# Altium schematic symbol library jlcpcb_2025_04_capacitors_extended_0402.schlib: 3594 symbols (part 8 of 20)
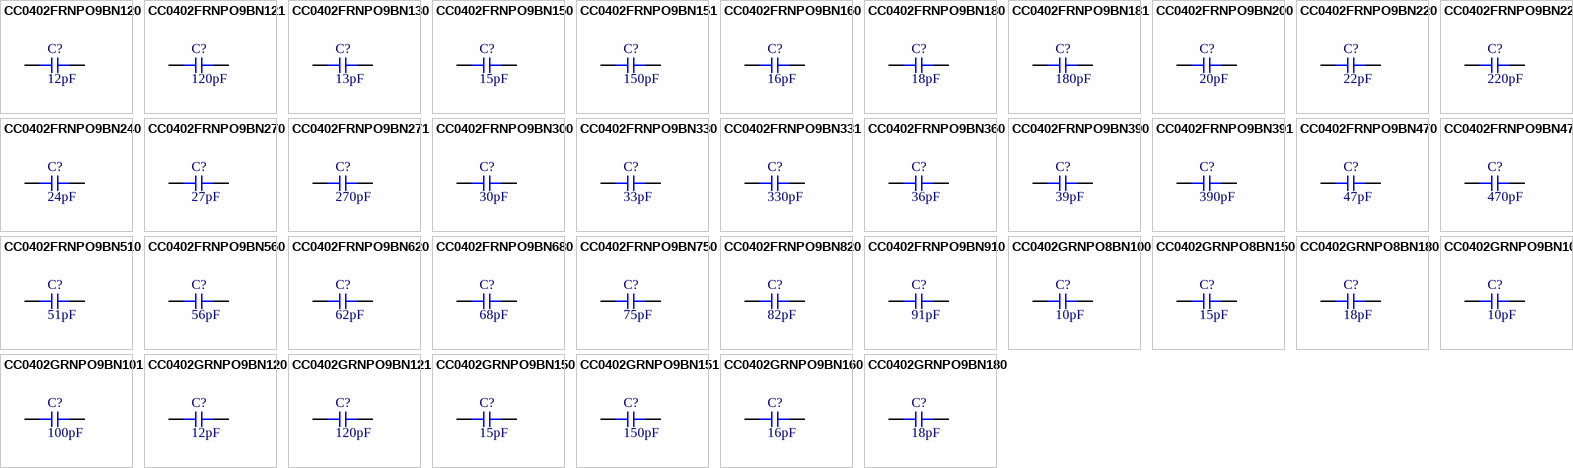
[diagram p96: symbols CC0402FRNPO9BN120 to CC0402GRNPO9BN180]

## CC0402FRNPO9BN470
designator C?  Capacitance: 47pF  (hidden comment: *)
Capacitor, Ceramic (MLCC), 47pF, ±1%, 50V, NP0, ±1%, SMD 0402; Manufacturer: YAGEO; Manufacturer Part Number: CC0402FRNPO9BN470; Package Size: 0402; JLCPCB Basic Part: No; JLCPCB Part Number: C277503; Supplier 1: LCSC; Category: Capacitors - MLCC; Supplier Part Number 1: C277503; Tolerance: ±1%; Voltage Rating: 50V; Temperature Coefficient: NP0; RoHS: Yes; ComponentLink1Description: Datasheet; ComponentLink1URL: https://wmsc.lcsc.com/wmsc/upload/file/pdf/v2/lcsc/2304140030_YAGEO-CC0402FRNPO9BN470_C277503.pdf; ComponentLink2Description: JLCPCB Part URL; ComponentLink2URL: https://jlcpcb.com/partdetail/C277503; ComponentLink3Description: LCSC Part URL; ComponentLink3URL: https://lcsc.com/product-detail/Multilayer-Ceramic-Capacitors-MLCC---SMD-SMT_YAGEO-YAGEO-CC0402FRNPO9BN470_C277503.html
footprint CAP-0402 (0402 (1005M) Capacitor)
pins: 1, 2

## CC0402FRNPO9BN471
designator C?  Capacitance: 470pF  (hidden comment: *)
Capacitor, Ceramic (MLCC), 470pF, ±1%, 50V, NP0, ±1%, SMD 0402; Manufacturer: YAGEO; Manufacturer Part Number: CC0402FRNPO9BN471; Package Size: 0402; JLCPCB Basic Part: No; JLCPCB Part Number: C513551; Supplier 1: LCSC; Category: Capacitors - MLCC; Supplier Part Number 1: C513551; Tolerance: ±1%; Voltage Rating: 50V; Temperature Coefficient: NP0; RoHS: Yes; ComponentLink1Description: Datasheet; ComponentLink1URL: https://wmsc.lcsc.com/wmsc/upload/file/pdf/v2/lcsc/2004231432_YAGEO-CC0402FRNPO9BN471_C513551.pdf; ComponentLink2Description: JLCPCB Part URL; ComponentLink2URL: https://jlcpcb.com/partdetail/C513551; ComponentLink3Description: LCSC Part URL; ComponentLink3URL: https://lcsc.com/product-detail/Multilayer-Ceramic-Capacitors-MLCC---SMD-SMT_YAGEO-YAGEO-CC0402FRNPO9BN471_C513551.html
footprint CAP-0402 (0402 (1005M) Capacitor)
pins: 1, 2

## CC0402FRNPO9BN510
designator C?  Capacitance: 51pF  (hidden comment: *)
Capacitor, Ceramic (MLCC), 51pF, ±1%, 50V, NP0, ±1%, SMD 0402; Manufacturer: YAGEO; Manufacturer Part Number: CC0402FRNPO9BN510; Package Size: 0402; JLCPCB Basic Part: No; JLCPCB Part Number: C541437; Supplier 1: LCSC; Category: Capacitors - MLCC; Supplier Part Number 1: C541437; Tolerance: ±1%; Voltage Rating: 50V; Temperature Coefficient: NP0; RoHS: Yes; ComponentLink1Description: Datasheet; ComponentLink1URL: https://wmsc.lcsc.com/wmsc/upload/file/pdf/v2/lcsc/2006151135_YAGEO-CC0402FRNPO9BN510_C541437.pdf; ComponentLink2Description: JLCPCB Part URL; ComponentLink2URL: https://jlcpcb.com/partdetail/C541437; ComponentLink3Description: LCSC Part URL; ComponentLink3URL: https://lcsc.com/product-detail/Multilayer-Ceramic-Capacitors-MLCC---SMD-SMT_YAGEO-YAGEO-CC0402FRNPO9BN510_C541437.html
footprint CAP-0402 (0402 (1005M) Capacitor)
pins: 1, 2

## CC0402FRNPO9BN560
designator C?  Capacitance: 56pF  (hidden comment: *)
Capacitor, Ceramic (MLCC), 56pF, ±1%, 50V, NP0, ±1%, SMD 0402; Manufacturer: YAGEO; Manufacturer Part Number: CC0402FRNPO9BN560; Package Size: 0402; JLCPCB Basic Part: No; JLCPCB Part Number: C526981; Supplier 1: LCSC; Category: Capacitors - MLCC; Supplier Part Number 1: C526981; Tolerance: ±1%; Voltage Rating: 50V; Temperature Coefficient: NP0; RoHS: Yes; ComponentLink1Description: Datasheet; ComponentLink1URL: https://wmsc.lcsc.com/wmsc/upload/file/pdf/v2/lcsc/2005262133_YAGEO-CC0402FRNPO9BN560_C526981.pdf; ComponentLink2Description: JLCPCB Part URL; ComponentLink2URL: https://jlcpcb.com/partdetail/C526981; ComponentLink3Description: LCSC Part URL; ComponentLink3URL: https://lcsc.com/product-detail/Multilayer-Ceramic-Capacitors-MLCC---SMD-SMT_YAGEO-YAGEO-CC0402FRNPO9BN560_C526981.html
footprint CAP-0402 (0402 (1005M) Capacitor)
pins: 1, 2

## CC0402FRNPO9BN620
designator C?  Capacitance: 62pF  (hidden comment: *)
Capacitor, Ceramic (MLCC), 62pF, ±1%, 50V, NP0, ±1%, SMD 0402; Manufacturer: YAGEO; Manufacturer Part Number: CC0402FRNPO9BN620; Package Size: 0402; JLCPCB Basic Part: No; JLCPCB Part Number: C541438; Supplier 1: LCSC; Category: Capacitors - MLCC; Supplier Part Number 1: C541438; Tolerance: ±1%; Voltage Rating: 50V; Temperature Coefficient: NP0; RoHS: Yes; ComponentLink1Description: Datasheet; ComponentLink1URL: https://wmsc.lcsc.com/wmsc/upload/file/pdf/v2/lcsc/2304140030_YAGEO-CC0402FRNPO9BN620_C541438.pdf; ComponentLink2Description: JLCPCB Part URL; ComponentLink2URL: https://jlcpcb.com/partdetail/C541438; ComponentLink3Description: LCSC Part URL; ComponentLink3URL: https://lcsc.com/product-detail/Multilayer-Ceramic-Capacitors-MLCC---SMD-SMT_YAGEO-YAGEO-CC0402FRNPO9BN620_C541438.html
footprint CAP-0402 (0402 (1005M) Capacitor)
pins: 1, 2

## CC0402FRNPO9BN680
designator C?  Capacitance: 68pF  (hidden comment: *)
Capacitor, Ceramic (MLCC), 68pF, ±1%, 50V, NP0, ±1%, SMD 0402; Manufacturer: YAGEO; Manufacturer Part Number: CC0402FRNPO9BN680; Package Size: 0402; JLCPCB Basic Part: No; JLCPCB Part Number: C389103; Supplier 1: LCSC; Category: Capacitors - MLCC; Supplier Part Number 1: C389103; Tolerance: ±1%; Voltage Rating: 50V; Temperature Coefficient: NP0; RoHS: Yes; ComponentLink1Description: Datasheet; ComponentLink1URL: https://wmsc.lcsc.com/wmsc/upload/file/pdf/v2/lcsc/1912111437_YAGEO-CC0402FRNPO9BN680_C389103.pdf; ComponentLink2Description: JLCPCB Part URL; ComponentLink2URL: https://jlcpcb.com/partdetail/C389103; ComponentLink3Description: LCSC Part URL; ComponentLink3URL: https://lcsc.com/product-detail/Multilayer-Ceramic-Capacitors-MLCC---SMD-SMT_YAGEO-YAGEO-CC0402FRNPO9BN680_C389103.html
footprint CAP-0402 (0402 (1005M) Capacitor)
pins: 1, 2

## CC0402FRNPO9BN750
designator C?  Capacitance: 75pF  (hidden comment: *)
Capacitor, Ceramic (MLCC), 75pF, 50V, NP0, SMD 0402; Manufacturer: YAGEO; Manufacturer Part Number: CC0402FRNPO9BN750; Package Size: 0402; JLCPCB Basic Part: No; JLCPCB Part Number: C541439; Supplier 1: LCSC; Category: Capacitors - MLCC; Supplier Part Number 1: C541439; Voltage Rating: 50V; Temperature Coefficient: NP0; RoHS: Yes; ComponentLink1Description: Datasheet; ComponentLink1URL: https://wmsc.lcsc.com/wmsc/upload/file/pdf/v2/lcsc/2006151135_YAGEO-CC0402FRNPO9BN750_C541439.pdf; ComponentLink2Description: JLCPCB Part URL; ComponentLink2URL: https://jlcpcb.com/partdetail/C541439; ComponentLink3Description: LCSC Part URL; ComponentLink3URL: https://lcsc.com/product-detail/Multilayer-Ceramic-Capacitors-MLCC---SMD-SMT_YAGEO-YAGEO-CC0402FRNPO9BN750_C541439.html
footprint CAP-0402 (0402 (1005M) Capacitor)
pins: 1, 2

## CC0402FRNPO9BN820
designator C?  Capacitance: 82pF  (hidden comment: *)
Capacitor, Ceramic (MLCC), 82pF, ±1%, 50V, NP0, ±1%, SMD 0402; Manufacturer: YAGEO; Manufacturer Part Number: CC0402FRNPO9BN820; Package Size: 0402; JLCPCB Basic Part: No; JLCPCB Part Number: C526982; Supplier 1: LCSC; Category: Capacitors - MLCC; Supplier Part Number 1: C526982; Tolerance: ±1%; Voltage Rating: 50V; Temperature Coefficient: NP0; RoHS: Yes; ComponentLink1Description: Datasheet; ComponentLink1URL: https://wmsc.lcsc.com/wmsc/upload/file/pdf/v2/lcsc/2006031834_YAGEO-CC0402FRNPO9BN820_C526982.pdf; ComponentLink2Description: JLCPCB Part URL; ComponentLink2URL: https://jlcpcb.com/partdetail/C526982; ComponentLink3Description: LCSC Part URL; ComponentLink3URL: https://lcsc.com/product-detail/Multilayer-Ceramic-Capacitors-MLCC---SMD-SMT_YAGEO-YAGEO-CC0402FRNPO9BN820_C526982.html
footprint CAP-0402 (0402 (1005M) Capacitor)
pins: 1, 2

## CC0402FRNPO9BN910
designator C?  Capacitance: 91pF  (hidden comment: *)
Capacitor, Ceramic (MLCC), 91pF, 50V, NP0, SMD 0402; Manufacturer: YAGEO; Manufacturer Part Number: CC0402FRNPO9BN910; Package Size: 0402; JLCPCB Basic Part: No; JLCPCB Part Number: C541440; Supplier 1: LCSC; Category: Capacitors - MLCC; Supplier Part Number 1: C541440; Voltage Rating: 50V; Temperature Coefficient: NP0; RoHS: Yes; ComponentLink1Description: Datasheet; ComponentLink1URL: https://wmsc.lcsc.com/wmsc/upload/file/pdf/v2/lcsc/2006151136_YAGEO-CC0402FRNPO9BN910_C541440.pdf; ComponentLink2Description: JLCPCB Part URL; ComponentLink2URL: https://jlcpcb.com/partdetail/C541440; ComponentLink3Description: LCSC Part URL; ComponentLink3URL: https://lcsc.com/product-detail/Multilayer-Ceramic-Capacitors-MLCC---SMD-SMT_YAGEO-YAGEO-CC0402FRNPO9BN910_C541440.html
footprint CAP-0402 (0402 (1005M) Capacitor)
pins: 1, 2

## CC0402GRNPO8BN100
designator C?  Capacitance: 10pF  (hidden comment: *)
Capacitor, Ceramic (MLCC), 10pF, ±2%, 25V, NP0, ±2%, SMD 0402; Manufacturer: YAGEO; Manufacturer Part Number: CC0402GRNPO8BN100; Package Size: 0402; JLCPCB Basic Part: No; JLCPCB Part Number: C526983; Supplier 1: LCSC; Category: Capacitors - MLCC; Supplier Part Number 1: C526983; Tolerance: ±2%; Voltage Rating: 25V; Temperature Coefficient: NP0; RoHS: Yes; ComponentLink1Description: Datasheet; ComponentLink1URL: https://wmsc.lcsc.com/wmsc/upload/file/pdf/v2/lcsc/2005261832_YAGEO-CC0402GRNPO8BN100_C526983.pdf; ComponentLink2Description: JLCPCB Part URL; ComponentLink2URL: https://jlcpcb.com/partdetail/C526983; ComponentLink3Description: LCSC Part URL; ComponentLink3URL: https://lcsc.com/product-detail/Multilayer-Ceramic-Capacitors-MLCC---SMD-SMT_YAGEO-YAGEO-CC0402GRNPO8BN100_C526983.html
footprint CAP-0402 (0402 (1005M) Capacitor)
pins: 1, 2

## CC0402GRNPO8BN150
designator C?  Capacitance: 15pF  (hidden comment: *)
Capacitor, Ceramic (MLCC), 15pF, ±2%, 25V, NP0, ±2%, SMD 0402; Manufacturer: YAGEO; Manufacturer Part Number: CC0402GRNPO8BN150; Package Size: 0402; JLCPCB Basic Part: No; JLCPCB Part Number: C326789; Supplier 1: LCSC; Category: Capacitors - MLCC; Supplier Part Number 1: C326789; Tolerance: ±2%; Voltage Rating: 25V; Temperature Coefficient: NP0; RoHS: Yes; ComponentLink1Description: Datasheet; ComponentLink1URL: https://wmsc.lcsc.com/wmsc/upload/file/pdf/v2/lcsc/1811141241_YAGEO-CC0402GRNPO8BN150_C326789.pdf; ComponentLink2Description: JLCPCB Part URL; ComponentLink2URL: https://jlcpcb.com/partdetail/C326789; ComponentLink3Description: LCSC Part URL; ComponentLink3URL: https://lcsc.com/product-detail/Multilayer-Ceramic-Capacitors-MLCC---SMD-SMT_YAGEO-YAGEO-CC0402GRNPO8BN150_C326789.html
footprint CAP-0402 (0402 (1005M) Capacitor)
pins: 1, 2

## CC0402GRNPO8BN180
designator C?  Capacitance: 18pF  (hidden comment: *)
Capacitor, Ceramic (MLCC), 18pF, ±2%, 25V, NP0, ±2%, SMD 0402; Manufacturer: YAGEO; Manufacturer Part Number: CC0402GRNPO8BN180; Package Size: 0402; JLCPCB Basic Part: No; JLCPCB Part Number: C526984; Supplier 1: LCSC; Category: Capacitors - MLCC; Supplier Part Number 1: C526984; Tolerance: ±2%; Voltage Rating: 25V; Temperature Coefficient: NP0; RoHS: Yes; ComponentLink1Description: Datasheet; ComponentLink1URL: https://wmsc.lcsc.com/wmsc/upload/file/pdf/v2/lcsc/2007221234_YAGEO-CC0402GRNPO8BN180_C526984.pdf; ComponentLink2Description: JLCPCB Part URL; ComponentLink2URL: https://jlcpcb.com/partdetail/C526984; ComponentLink3Description: LCSC Part URL; ComponentLink3URL: https://lcsc.com/product-detail/Multilayer-Ceramic-Capacitors-MLCC---SMD-SMT_YAGEO-YAGEO-CC0402GRNPO8BN180_C526984.html
footprint CAP-0402 (0402 (1005M) Capacitor)
pins: 1, 2

## CC0402GRNPO9BN100
designator C?  Capacitance: 10pF  (hidden comment: *)
Capacitor, Ceramic (MLCC), 10pF, ±2%, 50V, NP0, ±2%, SMD 0402; Manufacturer: YAGEO; Manufacturer Part Number: CC0402GRNPO9BN100; Package Size: 0402; JLCPCB Basic Part: No; JLCPCB Part Number: C325459; Supplier 1: LCSC; Category: Capacitors - MLCC; Supplier Part Number 1: C325459; Tolerance: ±2%; Voltage Rating: 50V; Temperature Coefficient: NP0; RoHS: Yes; ComponentLink1Description: Datasheet; ComponentLink1URL: https://wmsc.lcsc.com/wmsc/upload/file/pdf/v2/lcsc/1811070918_YAGEO-CC0402GRNPO9BN100_C325459.pdf; ComponentLink2Description: JLCPCB Part URL; ComponentLink2URL: https://jlcpcb.com/partdetail/C325459; ComponentLink3Description: LCSC Part URL; ComponentLink3URL: https://lcsc.com/product-detail/Multilayer-Ceramic-Capacitors-MLCC---SMD-SMT_YAGEO-YAGEO-CC0402GRNPO9BN100_C325459.html
footprint CAP-0402 (0402 (1005M) Capacitor)
pins: 1, 2

## CC0402GRNPO9BN101
designator C?  Capacitance: 100pF  (hidden comment: *)
Capacitor, Ceramic (MLCC), 100pF, ±2%, 50V, NP0, ±2%, SMD 0402; Manufacturer: YAGEO; Manufacturer Part Number: CC0402GRNPO9BN101; Package Size: 0402; JLCPCB Basic Part: No; JLCPCB Part Number: C277521; Supplier 1: LCSC; Category: Capacitors - MLCC; Supplier Part Number 1: C277521; Tolerance: ±2%; Voltage Rating: 50V; Temperature Coefficient: NP0; RoHS: Yes; ComponentLink1Description: Datasheet; ComponentLink1URL: https://wmsc.lcsc.com/wmsc/upload/file/pdf/v2/lcsc/2304140030_YAGEO-CC0402GRNPO9BN101_C277521.pdf; ComponentLink2Description: JLCPCB Part URL; ComponentLink2URL: https://jlcpcb.com/partdetail/C277521; ComponentLink3Description: LCSC Part URL; ComponentLink3URL: https://lcsc.com/product-detail/Multilayer-Ceramic-Capacitors-MLCC---SMD-SMT_YAGEO-YAGEO-CC0402GRNPO9BN101_C277521.html
footprint CAP-0402 (0402 (1005M) Capacitor)
pins: 1, 2

## CC0402GRNPO9BN120
designator C?  Capacitance: 12pF  (hidden comment: *)
Capacitor, Ceramic (MLCC), 12pF, ±2%, 50V, NP0, ±2%, SMD 0402; Manufacturer: YAGEO; Manufacturer Part Number: CC0402GRNPO9BN120; Package Size: 0402; JLCPCB Basic Part: No; JLCPCB Part Number: C526985; Supplier 1: LCSC; Category: Capacitors - MLCC; Supplier Part Number 1: C526985; Tolerance: ±2%; Voltage Rating: 50V; Temperature Coefficient: NP0; RoHS: Yes; ComponentLink1Description: Datasheet; ComponentLink1URL: https://wmsc.lcsc.com/wmsc/upload/file/pdf/v2/lcsc/2006101834_YAGEO-CC0402GRNPO9BN120_C526985.pdf; ComponentLink2Description: JLCPCB Part URL; ComponentLink2URL: https://jlcpcb.com/partdetail/C526985; ComponentLink3Description: LCSC Part URL; ComponentLink3URL: https://lcsc.com/product-detail/Multilayer-Ceramic-Capacitors-MLCC---SMD-SMT_YAGEO-YAGEO-CC0402GRNPO9BN120_C526985.html
footprint CAP-0402 (0402 (1005M) Capacitor)
pins: 1, 2

## CC0402GRNPO9BN121
designator C?  Capacitance: 120pF  (hidden comment: *)
Capacitor, Ceramic (MLCC), 120pF, ±2%, 50V, NP0, ±2%, SMD 0402; Manufacturer: YAGEO; Manufacturer Part Number: CC0402GRNPO9BN121; Package Size: 0402; JLCPCB Basic Part: No; JLCPCB Part Number: C526986; Supplier 1: LCSC; Category: Capacitors - MLCC; Supplier Part Number 1: C526986; Tolerance: ±2%; Voltage Rating: 50V; Temperature Coefficient: NP0; RoHS: Yes; ComponentLink1Description: Datasheet; ComponentLink1URL: https://wmsc.lcsc.com/wmsc/upload/file/pdf/v2/lcsc/2006031834_YAGEO-CC0402GRNPO9BN121_C526986.pdf; ComponentLink2Description: JLCPCB Part URL; ComponentLink2URL: https://jlcpcb.com/partdetail/C526986; ComponentLink3Description: LCSC Part URL; ComponentLink3URL: https://lcsc.com/product-detail/Multilayer-Ceramic-Capacitors-MLCC---SMD-SMT_YAGEO-YAGEO-CC0402GRNPO9BN121_C526986.html
footprint CAP-0402 (0402 (1005M) Capacitor)
pins: 1, 2

## CC0402GRNPO9BN150
designator C?  Capacitance: 15pF  (hidden comment: *)
Capacitor, Ceramic (MLCC), 15pF, ±2%, 50V, NP0, ±2%, SMD 0402; Manufacturer: YAGEO; Manufacturer Part Number: CC0402GRNPO9BN150; Package Size: 0402; JLCPCB Basic Part: No; JLCPCB Part Number: C325460; Supplier 1: LCSC; Category: Capacitors - MLCC; Supplier Part Number 1: C325460; Tolerance: ±2%; Voltage Rating: 50V; Temperature Coefficient: NP0; RoHS: Yes; ComponentLink1Description: Datasheet; ComponentLink1URL: https://wmsc.lcsc.com/wmsc/upload/file/pdf/v2/lcsc/1811070918_YAGEO-CC0402GRNPO9BN150_C325460.pdf; ComponentLink2Description: JLCPCB Part URL; ComponentLink2URL: https://jlcpcb.com/partdetail/C325460; ComponentLink3Description: LCSC Part URL; ComponentLink3URL: https://lcsc.com/product-detail/Multilayer-Ceramic-Capacitors-MLCC---SMD-SMT_YAGEO-YAGEO-CC0402GRNPO9BN150_C325460.html
footprint CAP-0402 (0402 (1005M) Capacitor)
pins: 1, 2

## CC0402GRNPO9BN151
designator C?  Capacitance: 150pF  (hidden comment: *)
Capacitor, Ceramic (MLCC), 150pF, ±2%, 50V, NP0, ±2%, SMD 0402; Manufacturer: YAGEO; Manufacturer Part Number: CC0402GRNPO9BN151; Package Size: 0402; JLCPCB Basic Part: No; JLCPCB Part Number: C541423; Supplier 1: LCSC; Category: Capacitors - MLCC; Supplier Part Number 1: C541423; Tolerance: ±2%; Voltage Rating: 50V; Temperature Coefficient: NP0; RoHS: Yes; ComponentLink1Description: Datasheet; ComponentLink1URL: https://wmsc.lcsc.com/wmsc/upload/file/pdf/v2/lcsc/2006151134_YAGEO-CC0402GRNPO9BN151_C541423.pdf; ComponentLink2Description: JLCPCB Part URL; ComponentLink2URL: https://jlcpcb.com/partdetail/C541423; ComponentLink3Description: LCSC Part URL; ComponentLink3URL: https://lcsc.com/product-detail/Multilayer-Ceramic-Capacitors-MLCC---SMD-SMT_YAGEO-YAGEO-CC0402GRNPO9BN151_C541423.html
footprint CAP-0402 (0402 (1005M) Capacitor)
pins: 1, 2

## CC0402GRNPO9BN160
designator C?  Capacitance: 16pF  (hidden comment: *)
Capacitor, Ceramic (MLCC), 16pF, ±2%, 50V, NP0, ±2%, SMD 0402; Manufacturer: YAGEO; Manufacturer Part Number: CC0402GRNPO9BN160; Package Size: 0402; JLCPCB Basic Part: No; JLCPCB Part Number: C513591; Supplier 1: LCSC; Category: Capacitors - MLCC; Supplier Part Number 1: C513591; Tolerance: ±2%; Voltage Rating: 50V; Temperature Coefficient: NP0; RoHS: Yes; ComponentLink1Description: Datasheet; ComponentLink1URL: https://wmsc.lcsc.com/wmsc/upload/file/pdf/v2/lcsc/2004231433_YAGEO-CC0402GRNPO9BN160_C513591.pdf; ComponentLink2Description: JLCPCB Part URL; ComponentLink2URL: https://jlcpcb.com/partdetail/C513591; ComponentLink3Description: LCSC Part URL; ComponentLink3URL: https://lcsc.com/product-detail/Multilayer-Ceramic-Capacitors-MLCC---SMD-SMT_YAGEO-YAGEO-CC0402GRNPO9BN160_C513591.html
footprint CAP-0402 (0402 (1005M) Capacitor)
pins: 1, 2

## CC0402GRNPO9BN180
designator C?  Capacitance: 18pF  (hidden comment: *)
Capacitor, Ceramic (MLCC), 18pF, ±2%, 50V, NP0, ±2%, SMD 0402; Manufacturer: YAGEO; Manufacturer Part Number: CC0402GRNPO9BN180; Package Size: 0402; JLCPCB Basic Part: No; JLCPCB Part Number: C114393; Supplier 1: LCSC; Category: Capacitors - MLCC; Supplier Part Number 1: C114393; Tolerance: ±2%; Voltage Rating: 50V; Temperature Coefficient: NP0; RoHS: Yes; ComponentLink1Description: Datasheet; ComponentLink1URL: https://wmsc.lcsc.com/wmsc/upload/file/pdf/v2/lcsc/2007151105_YAGEO-CC0402GRNPO9BN180_C114393.pdf; ComponentLink2Description: JLCPCB Part URL; ComponentLink2URL: https://jlcpcb.com/partdetail/C114393; ComponentLink3Description: LCSC Part URL; ComponentLink3URL: https://lcsc.com/product-detail/Multilayer-Ceramic-Capacitors-MLCC---SMD-SMT_YAGEO-YAGEO-CC0402GRNPO9BN180_C114393.html
footprint CAP-0402 (0402 (1005M) Capacitor)
pins: 1, 2

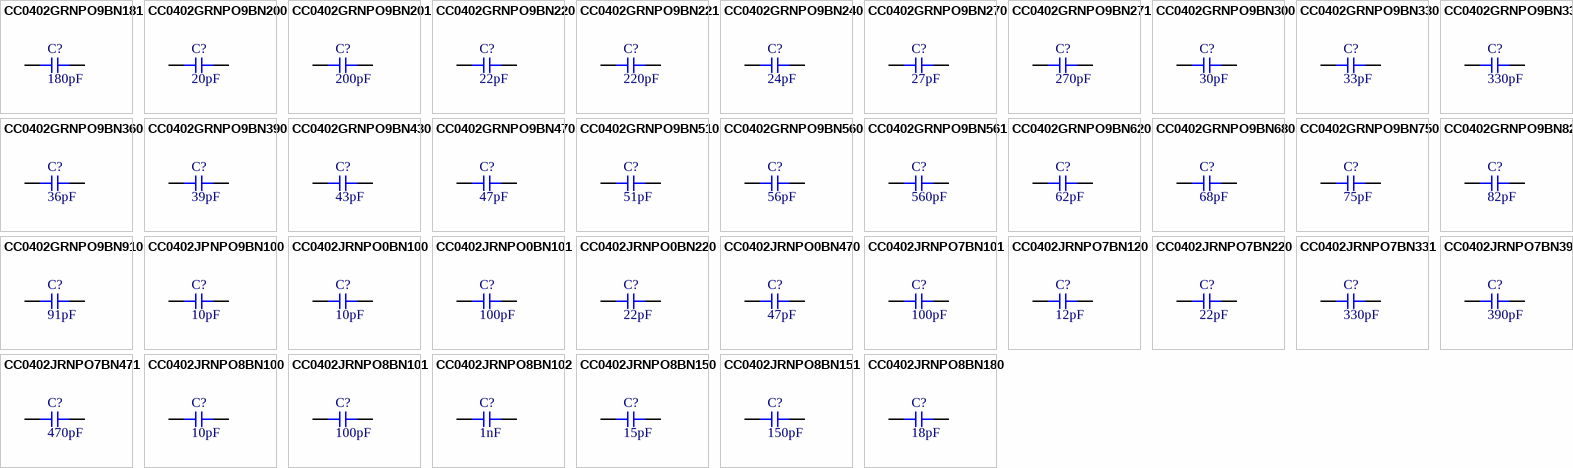
[diagram p33: symbols CC0402GRNPO9BN181 to CC0402JRNPO8BN180]

## CC0402GRNPO9BN181
designator C?  Capacitance: 180pF  (hidden comment: *)
Capacitor, Ceramic (MLCC), 180pF, ±2%, 50V, NP0, ±2%, SMD 0402; Manufacturer: YAGEO; Manufacturer Part Number: CC0402GRNPO9BN181; Package Size: 0402; JLCPCB Basic Part: No; JLCPCB Part Number: C541424; Supplier 1: LCSC; Category: Capacitors - MLCC; Supplier Part Number 1: C541424; Tolerance: ±2%; Voltage Rating: 50V; Temperature Coefficient: NP0; RoHS: Yes; ComponentLink1Description: Datasheet; ComponentLink1URL: https://wmsc.lcsc.com/wmsc/upload/file/pdf/v2/lcsc/2006151134_YAGEO-CC0402GRNPO9BN181_C541424.pdf; ComponentLink2Description: JLCPCB Part URL; ComponentLink2URL: https://jlcpcb.com/partdetail/C541424; ComponentLink3Description: LCSC Part URL; ComponentLink3URL: https://lcsc.com/product-detail/Multilayer-Ceramic-Capacitors-MLCC---SMD-SMT_YAGEO-YAGEO-CC0402GRNPO9BN181_C541424.html
footprint CAP-0402 (0402 (1005M) Capacitor)
pins: 1, 2

## CC0402GRNPO9BN200
designator C?  Capacitance: 20pF  (hidden comment: *)
Capacitor, Ceramic (MLCC), 20pF, ±2%, 50V, NP0, ±2%, SMD 0402; Manufacturer: YAGEO; Manufacturer Part Number: CC0402GRNPO9BN200; Package Size: 0402; JLCPCB Basic Part: No; JLCPCB Part Number: C541416; Supplier 1: LCSC; Category: Capacitors - MLCC; Supplier Part Number 1: C541416; Tolerance: ±2%; Voltage Rating: 50V; Temperature Coefficient: NP0; RoHS: Yes; ComponentLink1Description: Datasheet; ComponentLink1URL: https://wmsc.lcsc.com/wmsc/upload/file/pdf/v2/lcsc/2006151134_YAGEO-CC0402GRNPO9BN200_C541416.pdf; ComponentLink2Description: JLCPCB Part URL; ComponentLink2URL: https://jlcpcb.com/partdetail/C541416; ComponentLink3Description: LCSC Part URL; ComponentLink3URL: https://lcsc.com/product-detail/Multilayer-Ceramic-Capacitors-MLCC---SMD-SMT_YAGEO-YAGEO-CC0402GRNPO9BN200_C541416.html
footprint CAP-0402 (0402 (1005M) Capacitor)
pins: 1, 2

## CC0402GRNPO9BN201
designator C?  Capacitance: 200pF  (hidden comment: *)
Capacitor, Ceramic (MLCC), 200pF, ±2%, 50V, NP0, ±2%, SMD 0402; Manufacturer: YAGEO; Manufacturer Part Number: CC0402GRNPO9BN201; Package Size: 0402; JLCPCB Basic Part: No; JLCPCB Part Number: C541430; Supplier 1: LCSC; Category: Capacitors - MLCC; Supplier Part Number 1: C541430; Tolerance: ±2%; Voltage Rating: 50V; Temperature Coefficient: NP0; RoHS: Yes; ComponentLink1Description: Datasheet; ComponentLink1URL: https://wmsc.lcsc.com/wmsc/upload/file/pdf/v2/lcsc/2006151135_YAGEO-CC0402GRNPO9BN201_C541430.pdf; ComponentLink2Description: JLCPCB Part URL; ComponentLink2URL: https://jlcpcb.com/partdetail/C541430; ComponentLink3Description: LCSC Part URL; ComponentLink3URL: https://lcsc.com/product-detail/Multilayer-Ceramic-Capacitors-MLCC---SMD-SMT_YAGEO-YAGEO-CC0402GRNPO9BN201_C541430.html
footprint CAP-0402 (0402 (1005M) Capacitor)
pins: 1, 2

## CC0402GRNPO9BN220
designator C?  Capacitance: 22pF  (hidden comment: *)
Capacitor, Ceramic (MLCC), 22pF, ±2%, 50V, NP0, ±2%, SMD 0402; Manufacturer: YAGEO; Manufacturer Part Number: CC0402GRNPO9BN220; Package Size: 0402; JLCPCB Basic Part: No; JLCPCB Part Number: C541412; Supplier 1: LCSC; Category: Capacitors - MLCC; Supplier Part Number 1: C541412; Tolerance: ±2%; Voltage Rating: 50V; Temperature Coefficient: NP0; RoHS: Yes; ComponentLink1Description: Datasheet; ComponentLink1URL: https://wmsc.lcsc.com/wmsc/upload/file/pdf/v2/lcsc/2006151134_YAGEO-CC0402GRNPO9BN220_C541412.pdf; ComponentLink2Description: JLCPCB Part URL; ComponentLink2URL: https://jlcpcb.com/partdetail/C541412; ComponentLink3Description: LCSC Part URL; ComponentLink3URL: https://lcsc.com/product-detail/Multilayer-Ceramic-Capacitors-MLCC---SMD-SMT_YAGEO-YAGEO-CC0402GRNPO9BN220_C541412.html
footprint CAP-0402 (0402 (1005M) Capacitor)
pins: 1, 2

## CC0402GRNPO9BN221
designator C?  Capacitance: 220pF  (hidden comment: *)
Capacitor, Ceramic (MLCC), 220pF, ±2%, 50V, NP0, ±2%, SMD 0402; Manufacturer: YAGEO; Manufacturer Part Number: CC0402GRNPO9BN221; Package Size: 0402; JLCPCB Basic Part: No; JLCPCB Part Number: C541425; Supplier 1: LCSC; Category: Capacitors - MLCC; Supplier Part Number 1: C541425; Tolerance: ±2%; Voltage Rating: 50V; Temperature Coefficient: NP0; RoHS: Yes; ComponentLink1Description: Datasheet; ComponentLink1URL: https://wmsc.lcsc.com/wmsc/upload/file/pdf/v2/lcsc/2006151134_YAGEO-CC0402GRNPO9BN221_C541425.pdf; ComponentLink2Description: JLCPCB Part URL; ComponentLink2URL: https://jlcpcb.com/partdetail/C541425; ComponentLink3Description: LCSC Part URL; ComponentLink3URL: https://lcsc.com/product-detail/Multilayer-Ceramic-Capacitors-MLCC---SMD-SMT_YAGEO-YAGEO-CC0402GRNPO9BN221_C541425.html
footprint CAP-0402 (0402 (1005M) Capacitor)
pins: 1, 2

## CC0402GRNPO9BN240
designator C?  Capacitance: 24pF  (hidden comment: *)
Capacitor, Ceramic (MLCC), 24pF, ±2%, 50V, NP0, ±2%, SMD 0402; Manufacturer: YAGEO; Manufacturer Part Number: CC0402GRNPO9BN240; Package Size: 0402; JLCPCB Basic Part: No; JLCPCB Part Number: C541417; Supplier 1: LCSC; Category: Capacitors - MLCC; Supplier Part Number 1: C541417; Tolerance: ±2%; Voltage Rating: 50V; Temperature Coefficient: NP0; RoHS: Yes; ComponentLink1Description: Datasheet; ComponentLink1URL: https://wmsc.lcsc.com/wmsc/upload/file/pdf/v2/lcsc/2006151134_YAGEO-CC0402GRNPO9BN240_C541417.pdf; ComponentLink2Description: JLCPCB Part URL; ComponentLink2URL: https://jlcpcb.com/partdetail/C541417; ComponentLink3Description: LCSC Part URL; ComponentLink3URL: https://lcsc.com/product-detail/Multilayer-Ceramic-Capacitors-MLCC---SMD-SMT_YAGEO-YAGEO-CC0402GRNPO9BN240_C541417.html
footprint CAP-0402 (0402 (1005M) Capacitor)
pins: 1, 2

## CC0402GRNPO9BN270
designator C?  Capacitance: 27pF  (hidden comment: *)
Capacitor, Ceramic (MLCC), 27pF, ±2%, 50V, NP0, ±2%, SMD 0402; Manufacturer: YAGEO; Manufacturer Part Number: CC0402GRNPO9BN270; Package Size: 0402; JLCPCB Basic Part: No; JLCPCB Part Number: C114400; Supplier 1: LCSC; Category: Capacitors - MLCC; Supplier Part Number 1: C114400; Tolerance: ±2%; Voltage Rating: 50V; Temperature Coefficient: NP0; RoHS: Yes; ComponentLink1Description: Datasheet; ComponentLink1URL: https://wmsc.lcsc.com/wmsc/upload/file/pdf/v2/lcsc/2304140030_YAGEO-CC0402GRNPO9BN270_C114400.pdf; ComponentLink2Description: JLCPCB Part URL; ComponentLink2URL: https://jlcpcb.com/partdetail/C114400; ComponentLink3Description: LCSC Part URL; ComponentLink3URL: https://lcsc.com/product-detail/Multilayer-Ceramic-Capacitors-MLCC---SMD-SMT_YAGEO-YAGEO-CC0402GRNPO9BN270_C114400.html
footprint CAP-0402 (0402 (1005M) Capacitor)
pins: 1, 2

## CC0402GRNPO9BN271
designator C?  Capacitance: 270pF  (hidden comment: *)
Capacitor, Ceramic (MLCC), 270pF, ±2%, 50V, NP0, ±2%, SMD 0402; Manufacturer: YAGEO; Manufacturer Part Number: CC0402GRNPO9BN271; Package Size: 0402; JLCPCB Basic Part: No; JLCPCB Part Number: C541426; Supplier 1: LCSC; Category: Capacitors - MLCC; Supplier Part Number 1: C541426; Tolerance: ±2%; Voltage Rating: 50V; Temperature Coefficient: NP0; RoHS: Yes; ComponentLink1Description: Datasheet; ComponentLink1URL: https://wmsc.lcsc.com/wmsc/upload/file/pdf/v2/lcsc/2006151135_YAGEO-CC0402GRNPO9BN271_C541426.pdf; ComponentLink2Description: JLCPCB Part URL; ComponentLink2URL: https://jlcpcb.com/partdetail/C541426; ComponentLink3Description: LCSC Part URL; ComponentLink3URL: https://lcsc.com/product-detail/Multilayer-Ceramic-Capacitors-MLCC---SMD-SMT_YAGEO-YAGEO-CC0402GRNPO9BN271_C541426.html
footprint CAP-0402 (0402 (1005M) Capacitor)
pins: 1, 2

## CC0402GRNPO9BN300
designator C?  Capacitance: 30pF  (hidden comment: *)
Capacitor, Ceramic (MLCC), 30pF, ±2%, 50V, NP0, ±2%, SMD 0402; Manufacturer: YAGEO; Manufacturer Part Number: CC0402GRNPO9BN300; Package Size: 0402; JLCPCB Basic Part: No; JLCPCB Part Number: C277479; Supplier 1: LCSC; Category: Capacitors - MLCC; Supplier Part Number 1: C277479; Tolerance: ±2%; Voltage Rating: 50V; Temperature Coefficient: NP0; RoHS: Yes; ComponentLink1Description: Datasheet; ComponentLink1URL: https://wmsc.lcsc.com/wmsc/upload/file/pdf/v2/lcsc/2304140030_YAGEO-CC0402GRNPO9BN300_C277479.pdf; ComponentLink2Description: JLCPCB Part URL; ComponentLink2URL: https://jlcpcb.com/partdetail/C277479; ComponentLink3Description: LCSC Part URL; ComponentLink3URL: https://lcsc.com/product-detail/Multilayer-Ceramic-Capacitors-MLCC---SMD-SMT_YAGEO-YAGEO-CC0402GRNPO9BN300_C277479.html
footprint CAP-0402 (0402 (1005M) Capacitor)
pins: 1, 2

## CC0402GRNPO9BN330
designator C?  Capacitance: 33pF  (hidden comment: *)
Capacitor, Ceramic (MLCC), 33pF, ±2%, 50V, NP0, ±2%, SMD 0402; Manufacturer: YAGEO; Manufacturer Part Number: CC0402GRNPO9BN330; Package Size: 0402; JLCPCB Basic Part: No; JLCPCB Part Number: C325461; Supplier 1: LCSC; Category: Capacitors - MLCC; Supplier Part Number 1: C325461; Tolerance: ±2%; Voltage Rating: 50V; Temperature Coefficient: NP0; RoHS: Yes; ComponentLink1Description: Datasheet; ComponentLink1URL: https://wmsc.lcsc.com/wmsc/upload/file/pdf/v2/lcsc/1811070918_YAGEO-CC0402GRNPO9BN330_C325461.pdf; ComponentLink2Description: JLCPCB Part URL; ComponentLink2URL: https://jlcpcb.com/partdetail/C325461; ComponentLink3Description: LCSC Part URL; ComponentLink3URL: https://lcsc.com/product-detail/Multilayer-Ceramic-Capacitors-MLCC---SMD-SMT_YAGEO-YAGEO-CC0402GRNPO9BN330_C325461.html
footprint CAP-0402 (0402 (1005M) Capacitor)
pins: 1, 2

## CC0402GRNPO9BN331
designator C?  Capacitance: 330pF  (hidden comment: *)
Capacitor, Ceramic (MLCC), 330pF, ±2%, 50V, NP0, ±2%, SMD 0402; Manufacturer: YAGEO; Manufacturer Part Number: CC0402GRNPO9BN331; Package Size: 0402; JLCPCB Basic Part: No; JLCPCB Part Number: C541427; Supplier 1: LCSC; Category: Capacitors - MLCC; Supplier Part Number 1: C541427; Tolerance: ±2%; Voltage Rating: 50V; Temperature Coefficient: NP0; RoHS: Yes; ComponentLink1Description: Datasheet; ComponentLink1URL: https://wmsc.lcsc.com/wmsc/upload/file/pdf/v2/lcsc/2006151135_YAGEO-CC0402GRNPO9BN331_C541427.pdf; ComponentLink2Description: JLCPCB Part URL; ComponentLink2URL: https://jlcpcb.com/partdetail/C541427; ComponentLink3Description: LCSC Part URL; ComponentLink3URL: https://lcsc.com/product-detail/Multilayer-Ceramic-Capacitors-MLCC---SMD-SMT_YAGEO-YAGEO-CC0402GRNPO9BN331_C541427.html
footprint CAP-0402 (0402 (1005M) Capacitor)
pins: 1, 2

## CC0402GRNPO9BN360
designator C?  Capacitance: 36pF  (hidden comment: *)
Capacitor, Ceramic (MLCC), 36pF, ±2%, 50V, NP0, ±2%, SMD 0402; Manufacturer: YAGEO; Manufacturer Part Number: CC0402GRNPO9BN360; Package Size: 0402; JLCPCB Basic Part: No; JLCPCB Part Number: C541418; Supplier 1: LCSC; Category: Capacitors - MLCC; Supplier Part Number 1: C541418; Tolerance: ±2%; Voltage Rating: 50V; Temperature Coefficient: NP0; RoHS: Yes; ComponentLink1Description: Datasheet; ComponentLink1URL: https://wmsc.lcsc.com/wmsc/upload/file/pdf/v2/lcsc/2006151134_YAGEO-CC0402GRNPO9BN360_C541418.pdf; ComponentLink2Description: JLCPCB Part URL; ComponentLink2URL: https://jlcpcb.com/partdetail/C541418; ComponentLink3Description: LCSC Part URL; ComponentLink3URL: https://lcsc.com/product-detail/Multilayer-Ceramic-Capacitors-MLCC---SMD-SMT_YAGEO-YAGEO-CC0402GRNPO9BN360_C541418.html
footprint CAP-0402 (0402 (1005M) Capacitor)
pins: 1, 2

## CC0402GRNPO9BN390
designator C?  Capacitance: 39pF  (hidden comment: *)
Capacitor, Ceramic (MLCC), 39pF, ±2%, 50V, NP0, ±2%, SMD 0402; Manufacturer: YAGEO; Manufacturer Part Number: CC0402GRNPO9BN390; Package Size: 0402; JLCPCB Basic Part: No; JLCPCB Part Number: C541413; Supplier 1: LCSC; Category: Capacitors - MLCC; Supplier Part Number 1: C541413; Tolerance: ±2%; Voltage Rating: 50V; Temperature Coefficient: NP0; RoHS: Yes; ComponentLink1Description: Datasheet; ComponentLink1URL: https://wmsc.lcsc.com/wmsc/upload/file/pdf/v2/lcsc/2006151134_YAGEO-CC0402GRNPO9BN390_C541413.pdf; ComponentLink2Description: JLCPCB Part URL; ComponentLink2URL: https://jlcpcb.com/partdetail/C541413; ComponentLink3Description: LCSC Part URL; ComponentLink3URL: https://lcsc.com/product-detail/Multilayer-Ceramic-Capacitors-MLCC---SMD-SMT_YAGEO-YAGEO-CC0402GRNPO9BN390_C541413.html
footprint CAP-0402 (0402 (1005M) Capacitor)
pins: 1, 2

## CC0402GRNPO9BN430
designator C?  Capacitance: 43pF  (hidden comment: *)
Capacitor, Ceramic (MLCC), 43pF, ±2%, 50V, NP0, ±2%, SMD 0402; Manufacturer: YAGEO; Manufacturer Part Number: CC0402GRNPO9BN430; Package Size: 0402; JLCPCB Basic Part: No; JLCPCB Part Number: C526987; Supplier 1: LCSC; Category: Capacitors - MLCC; Supplier Part Number 1: C526987; Tolerance: ±2%; Voltage Rating: 50V; Temperature Coefficient: NP0; RoHS: Yes; ComponentLink1Description: Datasheet; ComponentLink1URL: https://wmsc.lcsc.com/wmsc/upload/file/pdf/v2/lcsc/2005141733_YAGEO-CC0402GRNPO9BN430_C526987.pdf; ComponentLink2Description: JLCPCB Part URL; ComponentLink2URL: https://jlcpcb.com/partdetail/C526987; ComponentLink3Description: LCSC Part URL; ComponentLink3URL: https://lcsc.com/product-detail/Multilayer-Ceramic-Capacitors-MLCC---SMD-SMT_YAGEO-YAGEO-CC0402GRNPO9BN430_C526987.html
footprint CAP-0402 (0402 (1005M) Capacitor)
pins: 1, 2

## CC0402GRNPO9BN470
designator C?  Capacitance: 47pF  (hidden comment: *)
Capacitor, Ceramic (MLCC), 47pF, ±2%, 50V, NP0, ±2%, SMD 0402; Manufacturer: YAGEO; Manufacturer Part Number: CC0402GRNPO9BN470; Package Size: 0402; JLCPCB Basic Part: No; JLCPCB Part Number: C526988; Supplier 1: LCSC; Category: Capacitors - MLCC; Supplier Part Number 1: C526988; Tolerance: ±2%; Voltage Rating: 50V; Temperature Coefficient: NP0; RoHS: Yes; ComponentLink1Description: Datasheet; ComponentLink1URL: https://wmsc.lcsc.com/wmsc/upload/file/pdf/v2/lcsc/2006031834_YAGEO-CC0402GRNPO9BN470_C526988.pdf; ComponentLink2Description: JLCPCB Part URL; ComponentLink2URL: https://jlcpcb.com/partdetail/C526988; ComponentLink3Description: LCSC Part URL; ComponentLink3URL: https://lcsc.com/product-detail/Multilayer-Ceramic-Capacitors-MLCC---SMD-SMT_YAGEO-YAGEO-CC0402GRNPO9BN470_C526988.html
footprint CAP-0402 (0402 (1005M) Capacitor)
pins: 1, 2

## CC0402GRNPO9BN510
designator C?  Capacitance: 51pF  (hidden comment: *)
Capacitor, Ceramic (MLCC), 51pF, ±2%, 50V, NP0, ±2%, SMD 0402; Manufacturer: YAGEO; Manufacturer Part Number: CC0402GRNPO9BN510; Package Size: 0402; JLCPCB Basic Part: No; JLCPCB Part Number: C541419; Supplier 1: LCSC; Category: Capacitors - MLCC; Supplier Part Number 1: C541419; Tolerance: ±2%; Voltage Rating: 50V; Temperature Coefficient: NP0; RoHS: Yes; ComponentLink1Description: Datasheet; ComponentLink1URL: https://wmsc.lcsc.com/wmsc/upload/file/pdf/v2/lcsc/2006151134_YAGEO-CC0402GRNPO9BN510_C541419.pdf; ComponentLink2Description: JLCPCB Part URL; ComponentLink2URL: https://jlcpcb.com/partdetail/C541419; ComponentLink3Description: LCSC Part URL; ComponentLink3URL: https://lcsc.com/product-detail/Multilayer-Ceramic-Capacitors-MLCC---SMD-SMT_YAGEO-YAGEO-CC0402GRNPO9BN510_C541419.html
footprint CAP-0402 (0402 (1005M) Capacitor)
pins: 1, 2

## CC0402GRNPO9BN560
designator C?  Capacitance: 56pF  (hidden comment: *)
Capacitor, Ceramic (MLCC), 56pF, ±2%, 50V, NP0, ±2%, SMD 0402; Manufacturer: YAGEO; Manufacturer Part Number: CC0402GRNPO9BN560; Package Size: 0402; JLCPCB Basic Part: No; JLCPCB Part Number: C526989; Supplier 1: LCSC; Category: Capacitors - MLCC; Supplier Part Number 1: C526989; Tolerance: ±2%; Voltage Rating: 50V; Temperature Coefficient: NP0; RoHS: Yes; ComponentLink1Description: Datasheet; ComponentLink1URL: https://wmsc.lcsc.com/wmsc/upload/file/pdf/v2/lcsc/2005261832_YAGEO-CC0402GRNPO9BN560_C526989.pdf; ComponentLink2Description: JLCPCB Part URL; ComponentLink2URL: https://jlcpcb.com/partdetail/C526989; ComponentLink3Description: LCSC Part URL; ComponentLink3URL: https://lcsc.com/product-detail/Multilayer-Ceramic-Capacitors-MLCC---SMD-SMT_YAGEO-YAGEO-CC0402GRNPO9BN560_C526989.html
footprint CAP-0402 (0402 (1005M) Capacitor)
pins: 1, 2

## CC0402GRNPO9BN561
designator C?  Capacitance: 560pF  (hidden comment: *)
Capacitor, Ceramic (MLCC), 560pF, ±2%, 50V, NP0, ±2%, SMD 0402; Manufacturer: YAGEO; Manufacturer Part Number: CC0402GRNPO9BN561; Package Size: 0402; JLCPCB Basic Part: No; JLCPCB Part Number: C726611; Supplier 1: LCSC; Category: Capacitors - MLCC; Supplier Part Number 1: C726611; Tolerance: ±2%; Voltage Rating: 50V; Temperature Coefficient: NP0; RoHS: Yes; ComponentLink1Description: Datasheet; ComponentLink1URL: https://wmsc.lcsc.com/wmsc/upload/file/pdf/v2/lcsc/2304140030_YAGEO-CC0402GRNPO9BN561_C726611.pdf; ComponentLink2Description: JLCPCB Part URL; ComponentLink2URL: https://jlcpcb.com/partdetail/C726611; ComponentLink3Description: LCSC Part URL; ComponentLink3URL: https://lcsc.com/product-detail/Multilayer-Ceramic-Capacitors-MLCC---SMD-SMT_YAGEO-YAGEO-CC0402GRNPO9BN561_C726611.html
footprint CAP-0402 (0402 (1005M) Capacitor)
pins: 1, 2

## CC0402GRNPO9BN620
designator C?  Capacitance: 62pF  (hidden comment: *)
Capacitor, Ceramic (MLCC), 62pF, ±2%, 50V, NP0, ±2%, SMD 0402; Manufacturer: YAGEO; Manufacturer Part Number: CC0402GRNPO9BN620; Package Size: 0402; JLCPCB Basic Part: No; JLCPCB Part Number: C541420; Supplier 1: LCSC; Category: Capacitors - MLCC; Supplier Part Number 1: C541420; Tolerance: ±2%; Voltage Rating: 50V; Temperature Coefficient: NP0; RoHS: Yes; ComponentLink1Description: Datasheet; ComponentLink1URL: https://wmsc.lcsc.com/wmsc/upload/file/pdf/v2/lcsc/2006151134_YAGEO-CC0402GRNPO9BN620_C541420.pdf; ComponentLink2Description: JLCPCB Part URL; ComponentLink2URL: https://jlcpcb.com/partdetail/C541420; ComponentLink3Description: LCSC Part URL; ComponentLink3URL: https://lcsc.com/product-detail/Multilayer-Ceramic-Capacitors-MLCC---SMD-SMT_YAGEO-YAGEO-CC0402GRNPO9BN620_C541420.html
footprint CAP-0402 (0402 (1005M) Capacitor)
pins: 1, 2

## CC0402GRNPO9BN680
designator C?  Capacitance: 68pF  (hidden comment: *)
Capacitor, Ceramic (MLCC), 68pF, ±2%, 50V, NP0, ±2%, SMD 0402; Manufacturer: YAGEO; Manufacturer Part Number: CC0402GRNPO9BN680; Package Size: 0402; JLCPCB Basic Part: No; JLCPCB Part Number: C526990; Supplier 1: LCSC; Category: Capacitors - MLCC; Supplier Part Number 1: C526990; Tolerance: ±2%; Voltage Rating: 50V; Temperature Coefficient: NP0; RoHS: Yes; ComponentLink1Description: Datasheet; ComponentLink1URL: https://wmsc.lcsc.com/wmsc/upload/file/pdf/v2/lcsc/2006031835_YAGEO-CC0402GRNPO9BN680_C526990.pdf; ComponentLink2Description: JLCPCB Part URL; ComponentLink2URL: https://jlcpcb.com/partdetail/C526990; ComponentLink3Description: LCSC Part URL; ComponentLink3URL: https://lcsc.com/product-detail/Multilayer-Ceramic-Capacitors-MLCC---SMD-SMT_YAGEO-YAGEO-CC0402GRNPO9BN680_C526990.html
footprint CAP-0402 (0402 (1005M) Capacitor)
pins: 1, 2

## CC0402GRNPO9BN750
designator C?  Capacitance: 75pF  (hidden comment: *)
Capacitor, Ceramic (MLCC), 75pF, ±2%, 50V, NP0, ±2%, SMD 0402; Manufacturer: YAGEO; Manufacturer Part Number: CC0402GRNPO9BN750; Package Size: 0402; JLCPCB Basic Part: No; JLCPCB Part Number: C541421; Supplier 1: LCSC; Category: Capacitors - MLCC; Supplier Part Number 1: C541421; Tolerance: ±2%; Voltage Rating: 50V; Temperature Coefficient: NP0; RoHS: Yes; ComponentLink1Description: Datasheet; ComponentLink1URL: https://wmsc.lcsc.com/wmsc/upload/file/pdf/v2/lcsc/2006151134_YAGEO-CC0402GRNPO9BN750_C541421.pdf; ComponentLink2Description: JLCPCB Part URL; ComponentLink2URL: https://jlcpcb.com/partdetail/C541421; ComponentLink3Description: LCSC Part URL; ComponentLink3URL: https://lcsc.com/product-detail/Multilayer-Ceramic-Capacitors-MLCC---SMD-SMT_YAGEO-YAGEO-CC0402GRNPO9BN750_C541421.html
footprint CAP-0402 (0402 (1005M) Capacitor)
pins: 1, 2

## CC0402GRNPO9BN820
designator C?  Capacitance: 82pF  (hidden comment: *)
Capacitor, Ceramic (MLCC), 82pF, ±2%, 50V, NP0, ±2%, SMD 0402; Manufacturer: YAGEO; Manufacturer Part Number: CC0402GRNPO9BN820; Package Size: 0402; JLCPCB Basic Part: No; JLCPCB Part Number: C541414; Supplier 1: LCSC; Category: Capacitors - MLCC; Supplier Part Number 1: C541414; Tolerance: ±2%; Voltage Rating: 50V; Temperature Coefficient: NP0; RoHS: Yes; ComponentLink1Description: Datasheet; ComponentLink1URL: https://wmsc.lcsc.com/wmsc/upload/file/pdf/v2/lcsc/2006151134_YAGEO-CC0402GRNPO9BN820_C541414.pdf; ComponentLink2Description: JLCPCB Part URL; ComponentLink2URL: https://jlcpcb.com/partdetail/C541414; ComponentLink3Description: LCSC Part URL; ComponentLink3URL: https://lcsc.com/product-detail/Multilayer-Ceramic-Capacitors-MLCC---SMD-SMT_YAGEO-YAGEO-CC0402GRNPO9BN820_C541414.html
footprint CAP-0402 (0402 (1005M) Capacitor)
pins: 1, 2

## CC0402GRNPO9BN910
designator C?  Capacitance: 91pF  (hidden comment: *)
Capacitor, Ceramic (MLCC), 91pF, ±2%, 50V, NP0, ±2%, SMD 0402; Manufacturer: YAGEO; Manufacturer Part Number: CC0402GRNPO9BN910; Package Size: 0402; JLCPCB Basic Part: No; JLCPCB Part Number: C1852861; Supplier 1: LCSC; Category: Capacitors - MLCC; Supplier Part Number 1: C1852861; Tolerance: ±2%; Voltage Rating: 50V; Temperature Coefficient: NP0; RoHS: Yes; ComponentLink1Description: Datasheet; ComponentLink1URL: https://wmsc.lcsc.com/wmsc/upload/file/pdf/v2/lcsc/2202151130_YAGEO-CC0402GRNPO9BN910_C1852861.pdf; ComponentLink2Description: JLCPCB Part URL; ComponentLink2URL: https://jlcpcb.com/partdetail/C1852861; ComponentLink3Description: LCSC Part URL; ComponentLink3URL: https://lcsc.com/product-detail/Multilayer-Ceramic-Capacitors-MLCC---SMD-SMT_YAGEO-YAGEO-CC0402GRNPO9BN910_C1852861.html
footprint CAP-0402 (0402 (1005M) Capacitor)
pins: 1, 2

## CC0402JPNPO9BN100
designator C?  Capacitance: 10pF  (hidden comment: *)
Capacitor, Ceramic (MLCC), 10pF, ±5%, null, NP0, ±5%, SMD 0402; Manufacturer: YAGEO; Manufacturer Part Number: CC0402JPNPO9BN100; Package Size: 0402; JLCPCB Basic Part: No; JLCPCB Part Number: C840736; Supplier 1: LCSC; Category: Capacitors - MLCC; Supplier Part Number 1: C840736; Tolerance: ±5%; Voltage Rating: null; Temperature Coefficient: NP0; RoHS: Yes; ComponentLink1Description: Datasheet; ComponentLink1URL: https://wmsc.lcsc.com/wmsc/upload/file/pdf/v2/lcsc/2302091809_YAGEO-CC0402JPNPO9BN100_C840736.pdf; ComponentLink2Description: JLCPCB Part URL; ComponentLink2URL: https://jlcpcb.com/partdetail/C840736; ComponentLink3Description: LCSC Part URL; ComponentLink3URL: https://lcsc.com/product-detail/Multilayer-Ceramic-Capacitors-MLCC---SMD-SMT_YAGEO-YAGEO-CC0402JPNPO9BN100_C840736.html
footprint CAP-0402 (0402 (1005M) Capacitor)
pins: 1, 2

## CC0402JRNPO0BN100
designator C?  Capacitance: 10pF  (hidden comment: *)
Capacitor, Ceramic (MLCC), 10pF, ±5%, 100V, NP0, ±5%, SMD 0402; Manufacturer: YAGEO; Manufacturer Part Number: CC0402JRNPO0BN100; Package Size: 0402; JLCPCB Basic Part: No; JLCPCB Part Number: C277518; Supplier 1: LCSC; Category: Capacitors - MLCC; Supplier Part Number 1: C277518; Tolerance: ±5%; Voltage Rating: 100V; Temperature Coefficient: NP0; RoHS: Yes; ComponentLink1Description: Datasheet; ComponentLink1URL: https://wmsc.lcsc.com/wmsc/upload/file/pdf/v2/lcsc/2304140030_YAGEO-CC0402JRNPO0BN100_C277518.pdf; ComponentLink2Description: JLCPCB Part URL; ComponentLink2URL: https://jlcpcb.com/partdetail/C277518; ComponentLink3Description: LCSC Part URL; ComponentLink3URL: https://lcsc.com/product-detail/Multilayer-Ceramic-Capacitors-MLCC---SMD-SMT_YAGEO-YAGEO-CC0402JRNPO0BN100_C277518.html
footprint CAP-0402 (0402 (1005M) Capacitor)
pins: 1, 2

## CC0402JRNPO0BN101
designator C?  Capacitance: 100pF  (hidden comment: *)
Capacitor, Ceramic (MLCC), 100pF, ±5%, 100V, NP0, ±5%, SMD 0402; Manufacturer: YAGEO; Manufacturer Part Number: CC0402JRNPO0BN101; Package Size: 0402; JLCPCB Basic Part: No; JLCPCB Part Number: C576700; Supplier 1: LCSC; Category: Capacitors - MLCC; Supplier Part Number 1: C576700; Tolerance: ±5%; Voltage Rating: 100V; Temperature Coefficient: NP0; RoHS: Yes; ComponentLink1Description: Datasheet; ComponentLink1URL: https://wmsc.lcsc.com/wmsc/upload/file/pdf/v2/lcsc/2203081130_YAGEO-CC0402JRNPO0BN101_C576700.pdf; ComponentLink2Description: JLCPCB Part URL; ComponentLink2URL: https://jlcpcb.com/partdetail/C576700; ComponentLink3Description: LCSC Part URL; ComponentLink3URL: https://lcsc.com/product-detail/Multilayer-Ceramic-Capacitors-MLCC---SMD-SMT_YAGEO-YAGEO-CC0402JRNPO0BN101_C576700.html
footprint CAP-0402 (0402 (1005M) Capacitor)
pins: 1, 2
